# Altium footprint library 00.PcbLib: 150 footprints (part 4 of 10)
Each footprint in its own frame and in the unit in brackets; x right, y up, seen from the top. Pads: shape width x height; smd on the part's side, far side on the other; paste and mask are expansions set on the pad; w line width, h text height; cw(c..) or ccw(c..) is an arc to the next point about the centre after c.
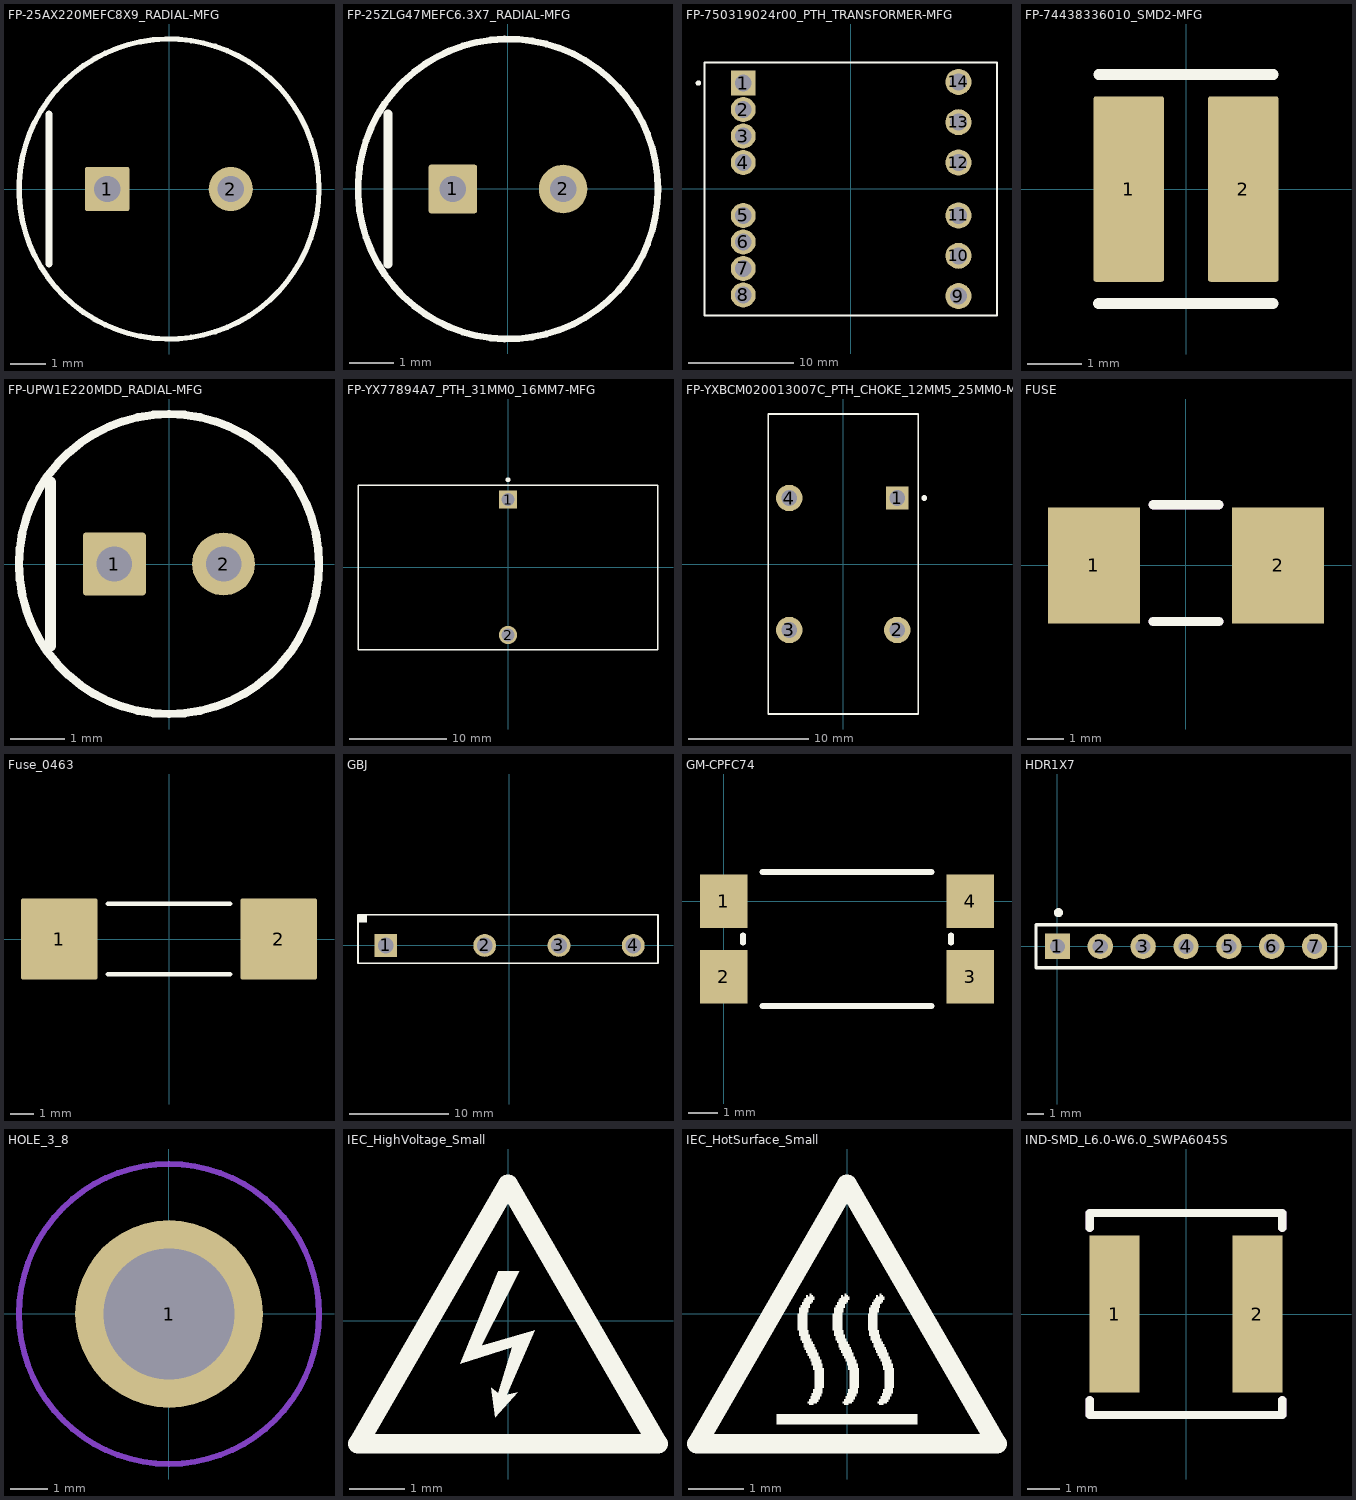
[diagram p3: the footprints below, top view; thin cyan lines are the x and y axes]

## FP-25AX220MEFC8X9_RADIAL-MFG [mm]
pads (2):
  rrect8% 1.25x1.25 hole 0.75 paste-1000 mask+0: 1(-1.75,0)
  round 1.25 hole 0.75 paste-1000 mask+0: 2(1.75,0)
Top Overlay:
  circle w0.15: c0,0 r4.25
  lines w0.2: -3.4,-2.125 -3.4,2.125
3D body "Cap_25AX220MEFC8X9_RADIAL.STEP": height 10.5, standoff -4, extent -4.003,-4.007 4,4.007

## FP-25ZLG47MEFC6.3X7_RADIAL-MFG [mm]
pads (2):
  rrect9% 1.1x1.1 hole 0.6 paste-1000 mask+0: 1(-1.25,0)
  round 1.1 hole 0.6 paste-1000 mask+0: 2(1.25,0)
Top Overlay:
  circle w0.15: c0,0 r3.4
  lines w0.2: -2.72,-1.7 -2.72,1.7
3D body "Cap_25ZLG47MEFC6.3X7_RADIAL.STEP": height 8, standoff -3.9, extent -3.15,-3.148 3.15,3.149

## FP-750319024r00_PTH_TRANSFORMER-MFG [mm]
pads (14):
  rrect4% 2.35x2.35 hole 1.6 paste-1000 mask+0: 1(-10.15,10)
  round 2.35 hole 1.6 paste-1000 mask+0: 2(-10.15,7.5) 3(-10.15,5) 4(-10.15,2.5) 5(-10.15,-2.5) 6(-10.15,-5) 7(-10.15,-7.5) 8(-10.15,-10)
  round 2.45 hole 1.6 paste-1000 mask+0: 9(10.15,-10.1) 10(10.15,-6.3) 11(10.15,-2.5) 12(10.15,2.5) 13(10.15,6.3) 14(10.15,10.1)
Top Overlay:
  circle w0.25: c-14.39,10 r0.125
  lines w0.2: -13.79,-11.95 -13.79,11.95 13.79,11.95 13.79,-11.95 -13.79,-11.95
3D body "Trans_750319024r00_PTH_TRANSFORMER.STEP": height 25.2, standoff -2.54, extent -13.79,-11.95 13.79,11.95

## FP-74438336010_SMD2-MFG [mm]
pads (2):
  rrect8% 1.3x3.4 smd paste+0 mask+0: 1(-1.05,0) 2(1.05,0)
Top Overlay:
  lines w0.2: -1.604,-2.097 1.596,-2.097 ; -1.6,2.1 1.6,2.1
3D body "Ind_74438336010_SMD2.STEP": height 2, standoff 0, extent -1.5,-1.5 1.5,1.5

## FP-UPW1E220MDD_RADIAL-MFG [mm]
pads (2):
  rrect9% 1.15x1.15 hole 0.65 paste-1000 mask+0: 1(-1,0)
  round 1.15 hole 0.65 paste-1000 mask+0: 2(1,0)
Top Overlay:
  circle w0.15: c0,0 r2.75
  lines w0.2: -2.175,-1.5 -2.175,1.5
3D body "Cap_UPW1E220MDD_RADIAL.STEP": height 12.5, standoff -3.9, extent -2.5,-2.499 2.5,2.497

## FP-YX77894A7_PTH_31MM0_16MM7-MFG [mm]
pads (2):
  rrect5% 1.9x1.9 hole 1.3 paste-1000 mask+0: 1(0,7)
  round 1.9 hole 1.3 paste-1000 mask+0: 2(0,-7)
Top Overlay:
  circle w0.25: c0,9.05 r0.125
  lines w0.15: -15.5,-8.5 15.5,-8.5 15.5,8.5 -15.5,8.5 -15.5,-8.5
3D body "Ind_YX77894A7_PTH_31MM0_16MM7.STEP": height 30.32, standoff -3.3, extent -15.068,-8.35 15.05,8.35

## FP-YXBCM020013007C_PTH_CHOKE_12MM5_25MM0-MFG [mm]
pads (4):
  rrect5% 1.9x1.9 hole 1.3 paste-1000 mask+0: 1(4.5,5.5)
  round 2.2 hole 1.3 paste-1000 mask+0: 2(4.5,-5.5) 3(-4.5,-5.5) 4(-4.5,5.5)
Top Overlay:
  circle w0.25: c6.75,5.5 r0.125
  lines w0.15: -6.25,-12.5 -6.25,12.5 6.25,12.5 6.25,-12.5 -6.25,-12.5
3D body "Ind_YXBCM020013007C_PTH_CHOKE_12MM5_25MM0.STEP": height 23.5, standoff -3, extent -6.25,-12.499 6.25,12.499

## FUSE [mm]
pads (2):
  rect 2.5x3.15 smd: 1(-2.5,0) 2(2.5,0)
Top Overlay:
  lines w0.254: -0.889,-1.524 0.889,-1.524 ; -0.889,1.651 0.889,1.651
Top Component Outline (Mech100):
  lines w0.254: -0.889,-1.524 0.889,-1.524 ; -0.889,1.651 0.889,1.651
3D body: height 2.69, standoff 0, extent -3.302,-1.524 3.429,1.524

## Fuse_0463 [mm]
pads (2):
  rrect3% 3.25x3.43 smd: 1(-4.675,0) 2(4.675,0)
Top Overlay:
  lines w0.2: -2.6,-1.5 2.6,-1.5 ; -2.6,1.5 2.6,1.5
3D body: height 3.12, standoff 0, extent 3.35,-1.56 5.05,1.56
3D body: height 3, standoff 0.2, extent -3.35,-1.4 3.35,1.4
3D body: height 3.12, standoff 0, extent -5.05,-1.56 -3.35,1.56

## GBJ [mm]
pads (4):
  rect 2.3x2.3 hole 1.6: 1(-12.5,0)
  round 2.3 hole 1.6: 2(-2.5,0) 3(5,0) 4(12.5,0)
Top Overlay:
  rectangle: -15.3,2.3 -14.4,3.1
  lines w0.2: -15.3,-1.8 -15.3,3.1 -11.8,3.1 15,3.1 15,-1.8 -15.3,-1.8
3D body "GBJ.stp": height 24.3, standoff -4, extent -15.25,-1.75 15.05,3.05

## GM-CPFC74 [mm]
pads (4):
  rect 1.6x1.8 smd: 1(0,0) 2(0,-2.54) 3(8.3,-2.54) 4(8.3,0)
Top Overlay:
  lines w0.2: 0.65,-1.397 0.65,-1.143 ; 1.3,-3.52 7,-3.52 ; 1.3,0.98 7,0.98 ; 7.65,-1.397 7.65,-1.143
3D body: height 5, standoff 0, extent 0.635,-3.556 7.62,1.016

## HDR1X7 [mm] "Connector; Header; 7 Position"
pads (7):
  rect 1.5x1.5 hole 0.9: 1(0,0)
  round 1.5 hole 0.9: 2(2.54,0) 3(5.08,0) 4(7.62,0) 5(10.16,0) 6(12.7,0) 7(15.24,0)
Top Overlay:
  circle w0.254: c0.059,2 r0.141
  lines w0.2: -1.27,-1.27 -1.27,1.27 16.51,1.27 16.51,-1.27 -1.27,-1.27
3D body "1001-7.STEP": height 8.54, standoff -3, extent -1.27,-1.27 16.51,1.27

## HOLE_3_8 [mm]
pads (1):
  round 5 hole 3.5: 1(0,0)
Top Layer keep-out:
  circle w0.152: c0,0 r4
Bottom Layer keep-out:
  circle w0.152: c0,0 r4

## IEC_HighVoltage_Small [mm]
Top Overlay:
  region: -0.178,0.889 0.203,0.889 -0.483,-0.457 0.483,-0.178 -0.025,-1.346 0.178,-1.295 -0.229,-1.753 -0.305,-1.219 -0.178,-1.321 0.076,-0.483 -0.864,-0.787
  lines w0.356: -2.718,-2.235 2.718,-2.235 0,2.472 -2.718,-2.235

## IEC_HotSurface_Small [mm]
Top Layer:
  pour cut-out: -1.905,0.889
  pour cut-out: -2.159,0.635
  pour cut-out: -2.159,0.635
Top Overlay:
  drawing of 10 lines, arcs and shapes, not listed

## IND-SMD_L6.0-W6.0_SWPA6045S [mm]
pads (2):
  rect 1.55x4.9 smd: 1(-2.225,0) 2(2.225,0)
Top Overlay:
  lines w0.254: -3,-2.681 -3,-3.15 3,-3.15 3,-2.681 ; -3,2.681 -3,3.15 3,3.15 3,2.681
Top Component Outline (Mech100):
  lines w0.254: -3,-2.681 -3,-3.15 3,-3.15 3,-2.681 ; -3,2.681 -3,3.15 3,3.15 3,2.681
3D body: height 2.8, standoff 0, extent -3.048,-3.175 3.048,3.175